# Altium footprint library PCBLIB.PcbLib: 775 footprints (part 17 of 49)
Each footprint in its own frame and in the unit in brackets; x right, y up, seen from the top. Pads: shape width x height; smd on the part's side, far side on the other; paste and mask are expansions set on the pad; w line width, h text height; cw(c..) or ccw(c..) is an arc to the next point about the centre after c.
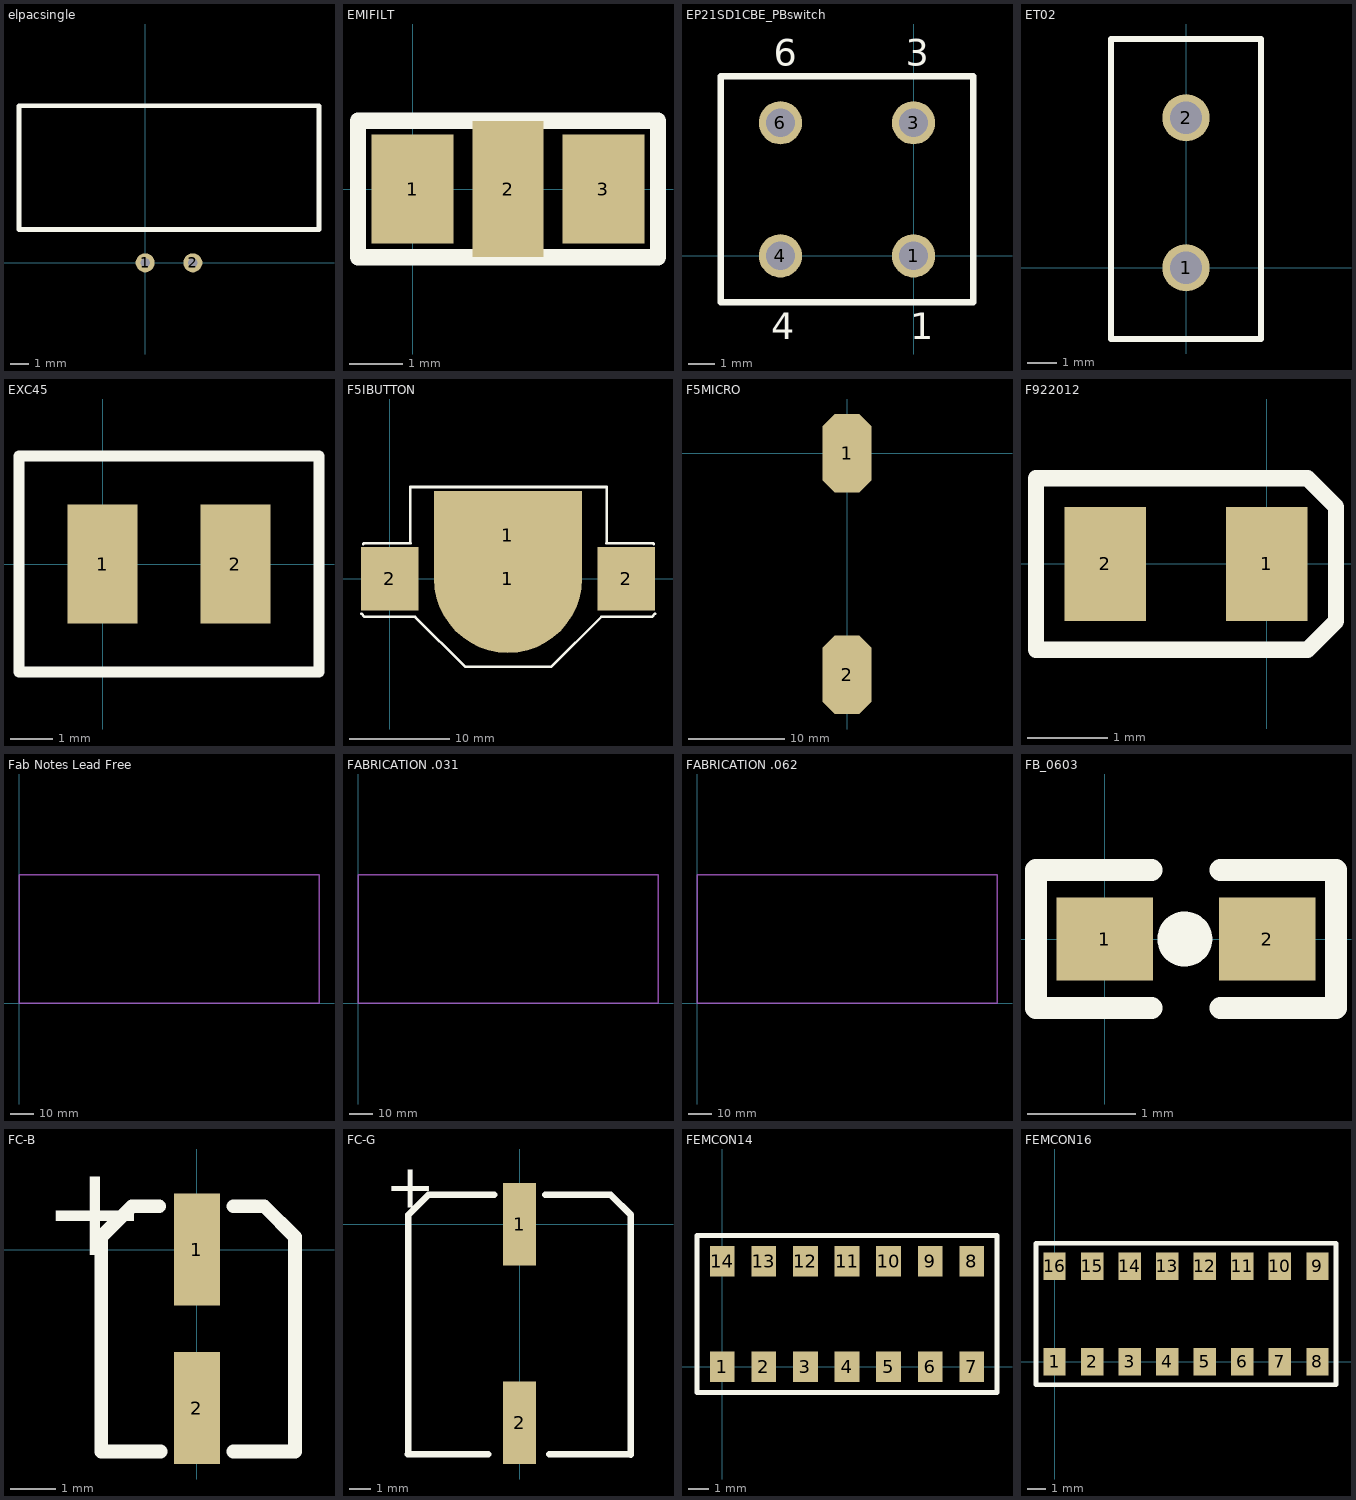
[diagram p16: the footprints below, top view; thin cyan lines are the x and y axes]

## elpacsingle [mil]
pads (2):
  round 40 hole 20: 1(0,0) 2(100,0)
TopOverlay:
  lines w10: -265,70 365,70 365,330 -265,330 -265,70

## EMIFILT [mil]
height 120
pads (3):
  rect 60x80 smd: 1(0,0) 3(140,0)
  rect 52x100 smd: 2(70,0)
TopOverlay:
  lines w12: -40,-50 180,-50 180,50 -40,50 -40,-50
Mechanical4:
  text ".072" at 0,0 h1
  text ".106" at 140.28,0.04 h1

## EP21SD1CBE_PBswitch [mil]
height 742
pads (4):
  round 65 hole 43: 1(0,0) 3(0,200) 4(-200,0) 6(-200,200)
TopOverlay:
  lines w10: -290,-70 90,-70 90,270 -290,270 -290,-70
  text "4" at -214,-125 h40
  text "3" at -12,286 h40
  text "6" at -210,286 h40
  text "1" at -5,-125 h40

## ET02 [mil]
pads (2):
  round 63 hole 43: 1(0,0) 2(0,200)
TopOverlay:
  lines w8: -100,-95 100,-95 100,305 -100,305 -100,-95

## EXC45 [mil]
pads (2):
  rect 65x110 smd: 1(0,0) 2(123,0)
TopOverlay:
  lines w10: -77.5,-100 200.5,-100 200.5,100 -77.5,100 -77.5,0 -77.5,-100

## F5IBUTTON [mil]
pads (4):
  round 582 smd: 1(465.35,0)
  rect 582x346 smd: 1(465.35,173)
  rect 225.2x250 smd: 2(0,0) 2(930.71,0)
TopOverlay:
  lines w10: -111.77,-136 -98.77,-149 100.16,-149 297.23,-346.06 466.29,-346.06 635.35,-346.06 832.42,-149 1031.35,-149 1044.35,-136 ; -104.65,137 -101.65,140 82.35,140 81.35,141 81.35,362 467.35,362 853.35,362 853.35,141 852.35,140 1036.35,140 1039.35,137
Mechanical4:
  text ".220" at 465.35,0 h1

## F5MICRO [mm]
pads (2):
  oct 5.1x8.2 smd: 1(0,0) 2(0,-23.1)
Mechanical4:
  text ".220" at 0,0 h0.03

## F922012 [mil]
height 47
pads (2):
  rect 40x56 smd: 1(0,0) 2(-79,0)
TopOverlay:
  lines w8: -113,-42 -113,42 0,42 20,42 34,28 34,-28 20,-42 0,-42 -113,-42

## Fab Notes Lead Free [mil]
Mechanical2:
  lines w24: 0,2011.77 0,2211.77 5150.39,2211.77 5150.39,0 0,0 0,2111.77
  text "11.CIRCUIT FINISH TYPE WILL BE ELECTROLESS NICKEL/IMMERSION GOLD (ENIG):" at 108.46,291.17 h60
  text ".005in FROM TRUE PAD CENTER." at 275.63,520.52 h60
  text "0.0000" at 0,171.77 h1
  text "10.SILKSCREEN BOARD WITH WHITE EPOXY INK." at 102.01,415.49 h60
  text "9. APPLY LPI SOLDERMASK TO BOTH SIDES OF THE BOARD, GREEN MATTE FINISH, SHALL MEET" at 99.88,754.16 h60
  text "A MINIMUM ANNULAR RING OF 0.002in." at 262.8,863.48 h60
  text "8. PLATED HOLES SHALL HAVE A MINIMUM WALL THICKNESS OF 0.001in AND" at 95.59,981.38 h60
  text "7. ALL HOLES PLATED" at 93.46,1099.27 h60
  text "5. BOARD THICKNESS WILL BE .031in, +/- 10% MEASURED OVER ALL APPLIED FINISHES" at 82.72,1337.19 h60
  text "4. 1 OZ. COPPER, ALL LAYERS" at 80.59,1444.37 h60
  text "BOARDS AND MULTILAYER BOARDS." at 836.61,1548.14 h60
  text "LEAD FREE, IN ACCORDANCE WITH ROHS, IPC-4101/124 MINIMUM FOR DOUBLE SIDED" at 834.72,1651.13 h60
  text "3. MATERIAL:" at 80,1651.77 h60
  text "2. FABRICATE IN ACCORDANCE WITH ANSI/IPC-600F,CLASS 2" at 80,1751.77 h60
  text "1. DRAWING PRESENTS TOP OF PCB" at 90,1851.77 h60
  text "NOTE: UNLESS OTHERWISE SPECIFIED" at 90,1976.77 h60
  text "6. FINISHED CONDUCTOR WIDTHS TO BE +/- .001in PER SIDE OF MASTER PATTERN SIZE." at 87.01,1221.45 h60
  text "MINIMUM REQUIREMENTS OF IPC-SM-840 CLASS III. SOLDERMASK REGISTRATION SHALL BE" at 271.34,636.27 h60
  text "ELECTROLESS NICKEL THICKNESS SHALL BE 120 TO 240 uIN." at 260,178 h60
  text "IMMERSION GOLD THICKNESS SHALL BE 2 TO 4 uIN." at 259,70 h60
Mechanical4:
  text "0" at 0,171.77 h1

## FABRICATION .031 [mil]
Mechanical2:
  lines w24: 0,2011.77 0,2211.77 5150.39,2211.77 5150.39,0 0,0 0,2111.77
  text "IMMERSION GOLD THICKNESS SHALL BE 2 TO 4 uIN." at 259,70 h60
  text "ELECTROLESS NICKEL THICKNESS SHALL BE 120 TO 240 uIN." at 260,178 h60
  text "MINIMUM REQUIREMENTS OF IPC-SM-840 CLASS III. SOLDERMASK REGISTRATION SHALL BE" at 271.34,636.27 h60
  text "6. FINISHED CONDUCTOR WIDTHS TO BE +/- .001in PER SIDE OF MASTER PATTERN SIZE." at 87.01,1221.45 h60
  text "NOTE: UNLESS OTHERWISE SPECIFIED" at 90,1976.77 h60
  text "1. DRAWING PRESENTS TOP OF PCB" at 90,1851.77 h60
  text "2. FABRICATE IN ACCORDANCE WITH ANSI/IPC-600F,CLASS 2" at 80,1751.77 h60
  text "3. MATERIAL:" at 80,1651.77 h60
  text "LEAD FREE, IN ACCORDANCE WITH ROHS, IPC-4101/124 MINIMUM FOR DOUBLE SIDED" at 834.72,1651.13 h60
  text "BOARDS AND MULTILAYER BOARDS." at 836.61,1548.14 h60
  text "4. 1 OZ. COPPER, ALL LAYERS" at 80.59,1444.37 h60
  text "5. BOARD THICKNESS WILL BE .031in, +/- 10% MEASURED OVER ALL APPLIED FINISHES" at 82.72,1337.19 h60
  text "7. ALL HOLES PLATED" at 93.46,1099.27 h60
  text "8. PLATED HOLES SHALL HAVE A MINIMUM WALL THICKNESS OF 0.001in AND" at 95.59,981.38 h60
  text "A MINIMUM ANNULAR RING OF 0.002in." at 262.8,863.48 h60
  text "9. APPLY LPI SOLDERMASK TO BOTH SIDES OF THE BOARD, GREEN MATTE FINISH, SHALL MEET" at 99.88,754.16 h60
  text "10.SILKSCREEN BOARD WITH WHITE EPOXY INK." at 102.01,415.49 h60
  text "0.0000" at 0,171.77 h1
  text ".005in FROM TRUE PAD CENTER." at 275.63,520.52 h60
  text "11.CIRCUIT FINISH TYPE WILL BE ELECTROLESS NICKEL/IMMERSION GOLD (ENIG):" at 108.46,291.17 h60
Mechanical4:
  text "0" at 0,171.77 h1

## FABRICATION .062 [mil]
Mechanical2:
  lines w24: 0,2011.77 0,2211.77 5150.39,2211.77 5150.39,0 0,0 0,2111.77
  text "IMMERSION GOLD THICKNESS SHALL BE 2 TO 4 uIN." at 259,70 h60
  text "ELECTROLESS NICKEL THICKNESS SHALL BE 120 TO 240 uIN." at 260,178 h60
  text "MINIMUM REQUIREMENTS OF IPC-SM-840 CLASS III. SOLDERMASK REGISTRATION SHALL BE" at 271.34,636.27 h60
  text "6. FINISHED CONDUCTOR WIDTHS TO BE +/- .001in PER SIDE OF MASTER PATTERN SIZE." at 87.01,1221.45 h60
  text "NOTE: UNLESS OTHERWISE SPECIFIED" at 90,1976.77 h60
  text "1. DRAWING PRESENTS TOP OF PCB" at 90,1851.77 h60
  text "2. FABRICATE IN ACCORDANCE WITH ANSI/IPC-600F,CLASS 2" at 80,1751.77 h60
  text "3. MATERIAL:" at 80,1651.77 h60
  text "COPPER CLAD FR-4, IN ACCORDANCE WITH IPC-4101/21 MINIMUM FOR DOUBLE SIDED" at 834.72,1651.13 h60
  text "BOARDS AND MULTILAYER BOARDS." at 836.61,1548.14 h60
  text "4. 1 OZ. COPPER, ALL LAYERS" at 80.59,1444.37 h60
  text "5. BOARD THICKNESS WILL BE .062in, +/- 10% MEASURED OVER ALL APPLIED FINISHES" at 82.72,1337.19 h60
  text "7. ALL HOLES PLATED" at 93.46,1099.27 h60
  text "8. PLATED HOLES SHALL HAVE A MINIMUM WALL THICKNESS OF 0.001in AND" at 95.59,981.38 h60
  text "A MINIMUM ANNULAR RING OF 0.002in." at 262.8,863.48 h60
  text "9. APPLY LPI SOLDERMASK TO BOTH SIDES OF THE BOARD, GREEN MATTE FINISH, SHALL MEET" at 99.88,754.16 h60
  text "10.SILKSCREEN BOARD WITH WHITE EPOXY INK." at 102.01,415.49 h60
  text "0.0000" at 0,171.77 h1
  text ".005in FROM TRUE PAD CENTER." at 275.63,520.52 h60
  text "11.CIRCUIT FINISH TYPE WILL BE ELECTROLESS NICKEL/IMMERSION GOLD (ENIG):" at 108.46,291.17 h60
Mechanical4:
  text "0" at 0,171.77 h1

## FB_0603 [mil]
height 25
pads (2):
  rect 35x30 smd: 1(0,0) 2(59,0)
TopOverlay:
  circle w10: c29.08,0 r4.99
  lines w8: 17,-25 -25,-25 -25,25 17,25 ; 42,-25 84,-25 84,25 42,25
Mechanical4:
  text "0.0311" at 2,0 h1

## FC-B [mil]
pads (2):
  rect 40x98 smd: 1(0,0) 2(0,-139)
TopOverlay:
  lines w12: -84,-177.29 -84,11 -57,38 -33,38 ; -84,-177 -32,-177 ; 32,-177 86,-177 ; 32,38 59,38 86,11 86,-177.29
  text "+" at -135,-5 h80

## FC-G [mil]
pads (2):
  rect 60x150 smd: 1(0,0) 2(0,-362)
TopOverlay:
  lines w12: -204,-419 -57,-419 ; -203,-419 -203,17 -166,54 -46,54 ; 47,54 166,54 203,17 203,-420 ; 54,-419 202,-419
  text "+" at -245,30 h80

## FEMCON14 [mil]
pads (14):
  rect 47x58 smd: 1(0,0) 2(79,0) 3(158,0) 4(237,0) 5(316,0) 6(395,0) 7(474,0) 8(474,200) 9(395,200) 10(316,200) 11(237,200) 12(158,200) 13(79,200) 14(0,200)
TopOverlay:
  lines w10: -48,-49 522,-49 522,249 -48,249 -48,-49

## FEMCON16 [mil]
pads (16):
  rect 47x58 smd: 1(0,0) 2(79,0) 3(158,0) 4(237,0) 5(316,0) 6(395,0) 7(474,0) 8(553,0) 9(553,200) 10(474,200) 11(395,200) 12(316,200) 13(237,200) 14(158,200) 15(79,200) 16(0,200)
TopOverlay:
  lines w10: -39,-49 -39,249 592,249 592,-49 -39,-49